# Altium footprint library Transistor.PcbLib: 86 footprints (part 5 of 6)
Each footprint in its own frame and in the unit in brackets; x right, y up, seen from the top. Pads: shape width x height; smd on the part's side, far side on the other; paste and mask are expansions set on the pad; w line width, h text height; cw(c..) or ccw(c..) is an arc to the next point about the centre after c.
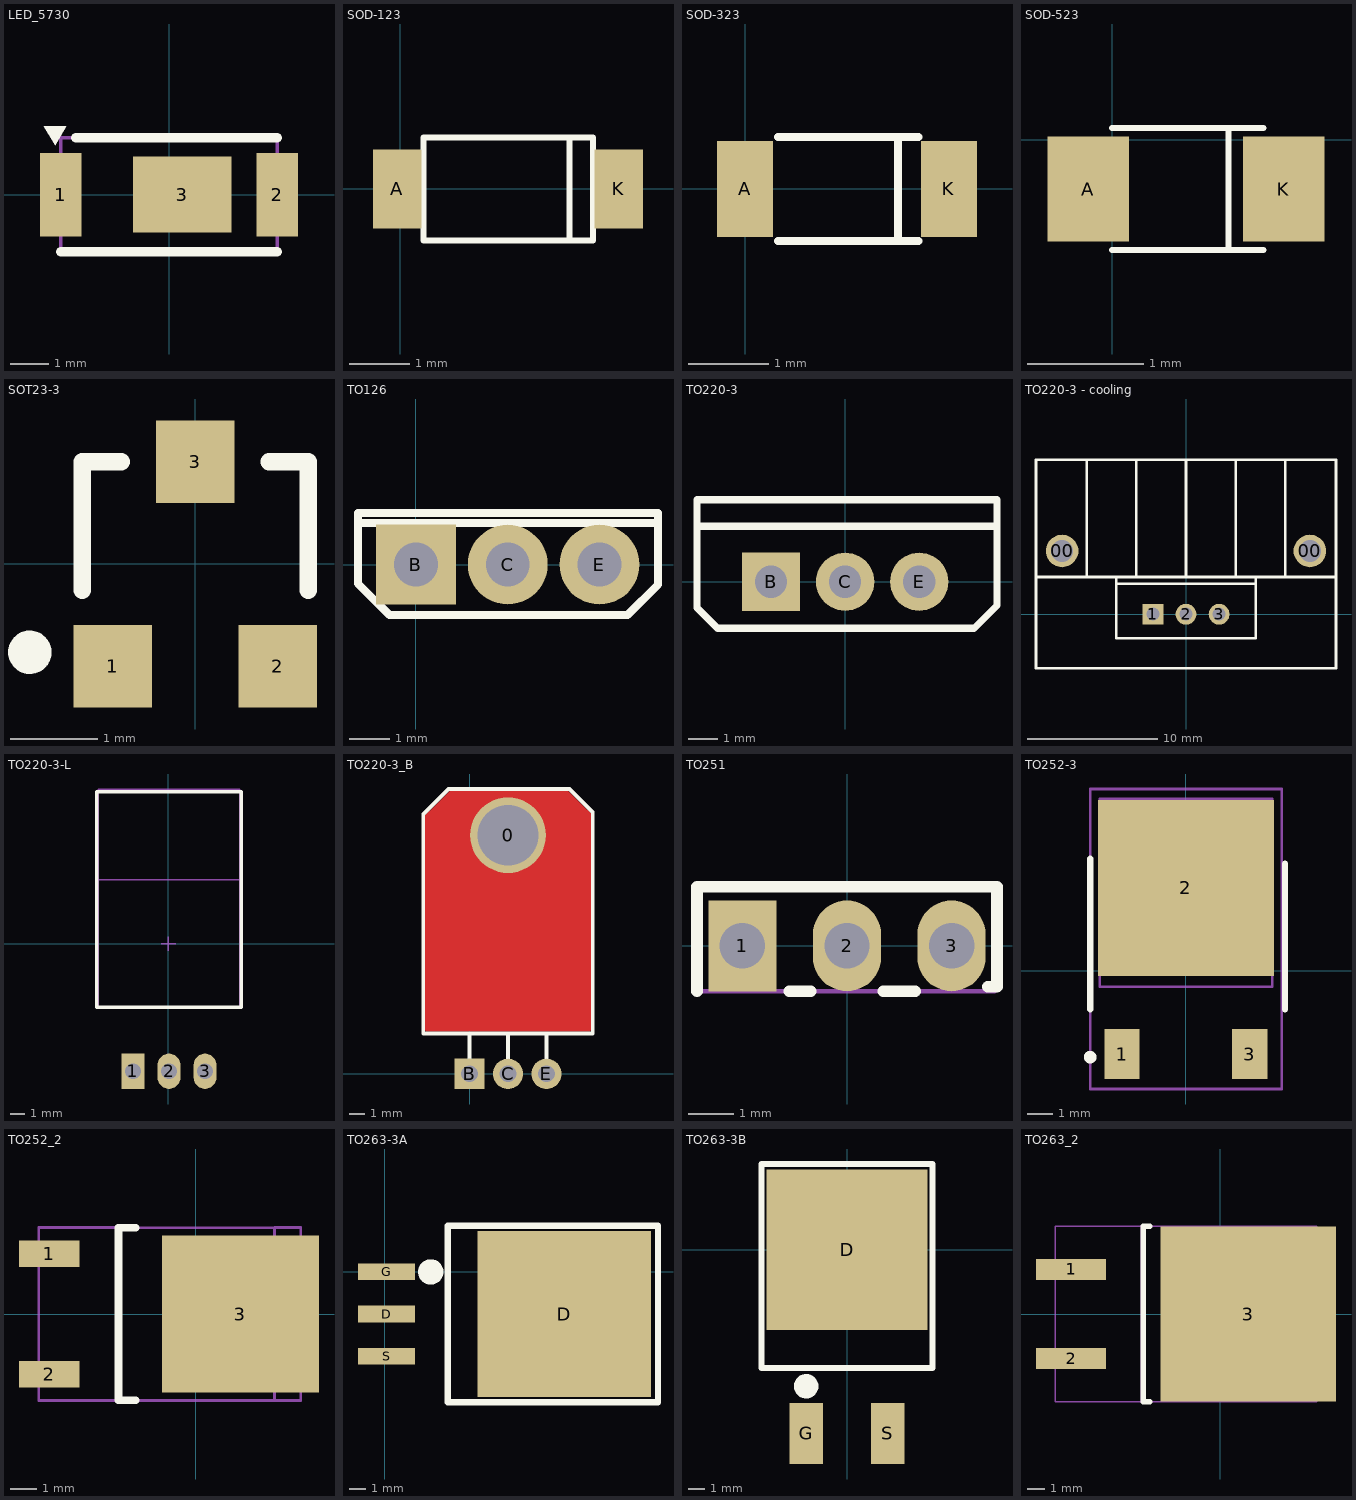
[diagram p4: the footprints below, top view; thin cyan lines are the x and y axes]

## LED_5730 [mm]
pads (3):
  rect 1.1x2.2 smd: 1(-2.85,0) 2(2.85,0)
  rect 2.6x2 smd: 3(0.35,0)
Top Overlay:
  region: -3.3,1.8 -2.7,1.8 -3,1.3
  lines w0.254: -2.85,-1.5 2.85,-1.5 ; -2.45,1.5 2.85,1.5
Mechanical 15:
  lines w0.1: -2.85,-1.5 2.85,-1.5 2.85,1.5 -2.85,1.5 -2.85,-1.5
3D body "LED 5730.step": height 0.9, standoff 0, extent -2.85,-1.5 2.85,1.5

## SOD-123 [mm] "塑封二极管"
pads (2):
  rect 0.8x1.3 smd: A(-0.051,0) K(3.607,0)
Top Overlay:
  lines w0.1: 2.794,-0.85 2.794,0.85 ; 0.381,-0.85 3.181,-0.85 3.181,0.85 0.381,0.85 0.381,-0.85
3D body "SOD-123_DiodesInc.STEP": height 1.43, standoff -0.02, extent -0.122,-0.889 3.728,0.811

## SOD-323 [mm] "塑封二极管"
pads (2):
  rect 0.7x1.2 smd: A(0,0) K(2.54,0)
Top Overlay:
  lines w0.1: 0.409,-0.651 2.157,-0.651 2.159,-0.649 ; 0.409,0.649 2.159,0.649 ; 1.905,-0.651 1.905,0.649
3D body "SOD323.STEP": height 0.9, standoff -0.09, extent 0.02,-0.635 2.52,0.615

## SOD-523 [mm] "塑封二极管"
pads (2):
  rect 0.7x0.9 smd: A(-0.203,-0.425) K(1.473,-0.425)
Top Overlay:
  lines w0.05: 0,-0.95 1.3,-0.95 ; 0,0.1 1.3,0.1 ; 1,-0.95 1,0.1
3D body "SOD-523.STEP": height 0.65, standoff 0, extent -0.165,-0.832 1.435,-0.032

## SOT23-3 [mm]
height 1.1
pads (3):
  rect 0.9x0.95 smd: 1(-0.95,-1.175) 2(0.95,-1.175) 3(0,1.175)
Top Overlay:
  circle w0.25: c-1.903,-1.016 r0.125
  lines w0.2: -1.3,-0.3 -1.3,1.175 -0.85,1.175 ; 0.85,1.175 1.3,1.175 1.3,-0.3
3D body "SOT23-3.STEP": height 1.2, standoff 0, extent -1.45,-1.4 1.45,1.4

## TO126 [mm] "126晶体管"
pads (3):
  rect 2x2 hole 1.1: B(0,0)
  round 2 hole 1.1: C(2.3,0) E(4.6,0)
Top Overlay:
  lines w0.2: -1.434,1.041 6.034,1.041 ; -1.452,-0.48 -1.452,1.295 6.067,1.295 6.067,-0.506 5.305,-1.268 -0.664,-1.268 -1.452,-0.48
3D body "23.STEP": height 15, standoff -4, extent -1.7,-1.27 6.3,1.53

## TO220-3 [mm] "220，3脚晶体管"
pads (3):
  rect 2x2 hole 1.1: B(-2.54,0)
  round 2 hole 1.1: C(0,0) E(2.54,0)
Top Overlay:
  lines w0.254: -4.928,1.905 5.131,1.905 ; -5.08,-0.889 -5.08,2.819 5.207,2.819 5.207,-0.813 4.42,-1.6 -4.369,-1.6 -5.08,-0.889
3D body "4.STEP": height 18.5, standoff -4, extent -5.08,-1.453 5.22,2.977

## TO220-3 - cooling [mm]
height 19.4
pads (5):
  round 2.5 hole 1.7: 00(-9.5,4.85) 00(9.5,4.85)
  rect 1.6x1.6 hole 1: 1(-2.54,0)
  round 1.6 hole 1: 2(0,0) 3(2.54,0)
Top Overlay:
  lines w0.2: -11.5,2.85 11.5,2.85 ; -7.62,2.85 -7.62,11.85 ; -5.35,2.35 5.35,2.35 ; -3.81,2.85 -3.81,11.74 ; 0,2.85 0,11.85 ; 3.81,2.85 3.81,11.85 ; 7.62,2.85 7.62,11.85 ; -11.5,-4.15 -11.5,11.85 11.5,11.85 11.5,-4.15 -11.5,-4.15 ; -5.35,-1.85 -5.35,2.85 5.35,2.85 5.35,-1.85 -5.35,-1.85
3D body "User Library-Transistors TO-220 3L.STEP": height 18.6, standoff -9.87, extent -5.08,-1.651 5.08,2.7

## TO220-3-L [mm]
pads (3):
  rect 1.6x2.5 hole 1.1: 1(-2.5,-9)
  oval 1.6x2.5 hole 1.1: 2(0.04,-9) 3(2.58,-9)
Top Overlay:
  lines w0.254: -5.06,-4.5 -5.06,10.7 5.14,10.7 5.14,-4.5 -5.06,-4.5
Mechanical 15:
  lines w0.1: -4.96,4.5 5.04,4.5 ; -0.5,0 0.5,0 ; 0,-0.5 0,0.5 ; -4.96,-4.5 5.04,-4.5 5.04,10.9 -4.96,10.9 -4.96,-4.5
3D body "TO-220-3-2.step": height 4.5, standoff -3, extent -4.965,-9.24 5.035,10.464

## TO220-3_B [mm] "220，3脚晶体管"
pads (4):
  round 5 hole 4: 0(2.54,15.748)
  rect 2x2 hole 1.1: B(0,0)
  round 2 hole 1.1: C(2.54,0) E(5.08,0)
Top Layer:
  rectangle: 6.35,17.526 6.985,18.034
  rectangle: 6.985,16.891 7.683,17.335
  rectangle: -2.286,17.018 -2.032,17.526
  rectangle: -1.778,17.653 -1.27,18.034
  rectangle: -2.032,16.891 -1.27,17.653
  rectangle: 6.604,16.891 7.239,17.78
  rectangle: -1.27,16.891 6.604,18.542
  rectangle: -2.794,2.921 7.874,17.018
  lines w0.254: -2.667,16.891 -1.27,18.288 ; -2.286,17.018 -1.27,18.034 ; 6.477,18.288 7.366,17.272 7.874,17.018 7.239,17.526 ; -2.794,2.921 -2.54,2.921 7.874,2.921 7.874,3.429 7.874,17.145 7.493,17.526 6.477,18.542 5.969,18.542 -1.27,18.542 -2.286,17.526 -2.794,17.018 -2.794,16.637 -2.794,2.921
Top Overlay:
  lines w0.254: 0,0.737 0,2.667 ; 2.54,0.711 2.54,2.667 ; 5.08,0.686 5.08,2.667 ; -3.048,2.667 -3.048,17.145 -1.397,18.796 6.604,18.796 8.128,17.272 8.128,2.667 -3.048,2.667
3D body "14.STEP": height 4.43, standoff -3, extent -2.61,-0.254 7.69,18.496

## TO251 [mm]
pads (3):
  rect 1.5x2 hole 1: 1(-2.3,0)
  oval 1.5x2 hole 1: 2(0,0) 3(2.3,0)
Top Overlay:
  lines w0.254: -3.3,-1 -3.3,1.3 3.3,1.3 3.3,-0.9 3.1,-0.9 ; -1.275,-1 -0.8,-1 ; 0.8,-1 1.5,-1
Mechanical 15:
  lines w0.1: -3.25,-1 -3.25,1.3 3.25,1.3 3.25,-1 -3.25,-1
3D body "TO-251.step": height 10.37, standoff -6.65, extent -3.25,-1 3.25,1.3

## TO252-3 [mm] "D2-PAK"
height 4.69
pads (3):
  rect 1.4x2 smd: 1(-2.54,-3.302) 3(2.54,-3.302)
  rect 7x7 smd: 2(0,3.302)
Top Overlay:
  circle w0.25: c-3.81,-3.427 r0.125
  lines w0.254: -3.81,-1.524 -3.81,4.467 ; 3.937,-1.524 3.937,4.267
Mechanical 13:
  lines w0.1: -3.429,-0.635 3.429,-0.635 3.429,6.858 -3.429,6.858 -3.429,-0.635
Mechanical 15:
  lines w0.1: -0.5,3.556 0.5,3.556 ; 0,3.056 0,4.056 ; -3.81,-4.694 3.81,-4.694 3.81,7.239 -3.81,7.239 -3.81,-4.694
3D body "User Library-DPAK-1.STEP": height 2.39, standoff -0.02, extent -3.27,-3.81 3.27,6.128

## TO252_2 [mm]
pads (3):
  rect 2.3x1 smd: 1(-5.6,2.3) 2(-5.6,-2.3)
  rect 6x6 smd: 3(1.7,0)
Top Overlay:
  lines w0.3: -2.294,-3.29 -2.95,-3.29 -2.95,3.29 -2.294,3.29
Mechanical 15:
  lines w0.1: -3,3.29 3,3.29 ; -3,-3.3 -3,3.3 -6,3.3 -6,-3.3 -3,-3.3 ; -3,-3.3 3,-3.3 ; 3,-3.3 3,3.3 4,3.3 4,-3.3 3,-3.3
3D body "TO252AA.STEP": height 2.3, standoff -0.01, extent -5.5,-3.29 4.2,3.29

## TO263-3A [mm]
height 4.5
pads (4):
  rect 3.45x1 smd: D(0.125,-2.54) G(0.125,0) S(0.125,-5.08)
  rect 10.5x10 smd: D(10.85,-2.54)
Top Overlay:
  circle w0.762: c2.794,0 r0.381
  lines w0.381: 3.81,-7.874 3.81,2.794 5.842,2.794 16.51,2.794 16.51,-7.874 6.096,-7.874 3.81,-7.874
3D body "TO263-3.STEP": height 4.7, standoff 0, extent 0.66,-7.493 15.088,2.507

## TO263-3B [mm]
pads (3):
  rect 10x10 smd: D(0,0)
  rect 2.1x3.8 smd: G(-2.54,-11.45) S(2.54,-11.45)
Top Overlay:
  circle w0.762: c-2.54,-8.509 r0.381
  lines w0.381: -5.334,-7.366 5.334,-7.366 5.334,-5.588 5.334,5.334 -5.334,5.334 -5.334,-5.588 -5.334,-7.366
3D body "1.STEP": height 4.5, standoff 0, extent -4.92,-11.049 5.08,3.881

## TO263_2 [mm]
pads (3):
  rect 4x1.2 smd: 1(-8.5,2.54) 2(-8.5,-2.54)
  rect 10x10 smd: 3(1.6,0)
Top Overlay:
  lines w0.3: -4.006,-5 -4.387,-5 -4.387,5 -4.006,5
Mechanical 15:
  lines w0.1: -4.5,-5 -4.5,5 ; -4.5,-5 4.5,-5 ; -4.5,-5 -9.4,-5 -9.4,5 -4.5,5 ; -4.5,5 4.5,5 ; 4.5,-5 4.5,5 ; 4.5,-5 5.5,-5 5.5,5 4.5,5
3D body "User Library-DPAK.step": height 4.98, standoff -0.03, extent -9.4,-5.1 5.864,5.06